# Altium footprint library Footprints.PcbLib: 236 footprints (part 9 of 15)
Each footprint in its own frame and in the unit in brackets; x right, y up, seen from the top. Pads: shape width x height; smd on the part's side, far side on the other; paste and mask are expansions set on the pad; w line width, h text height; cw(c..) or ccw(c..) is an arc to the next point about the centre after c.
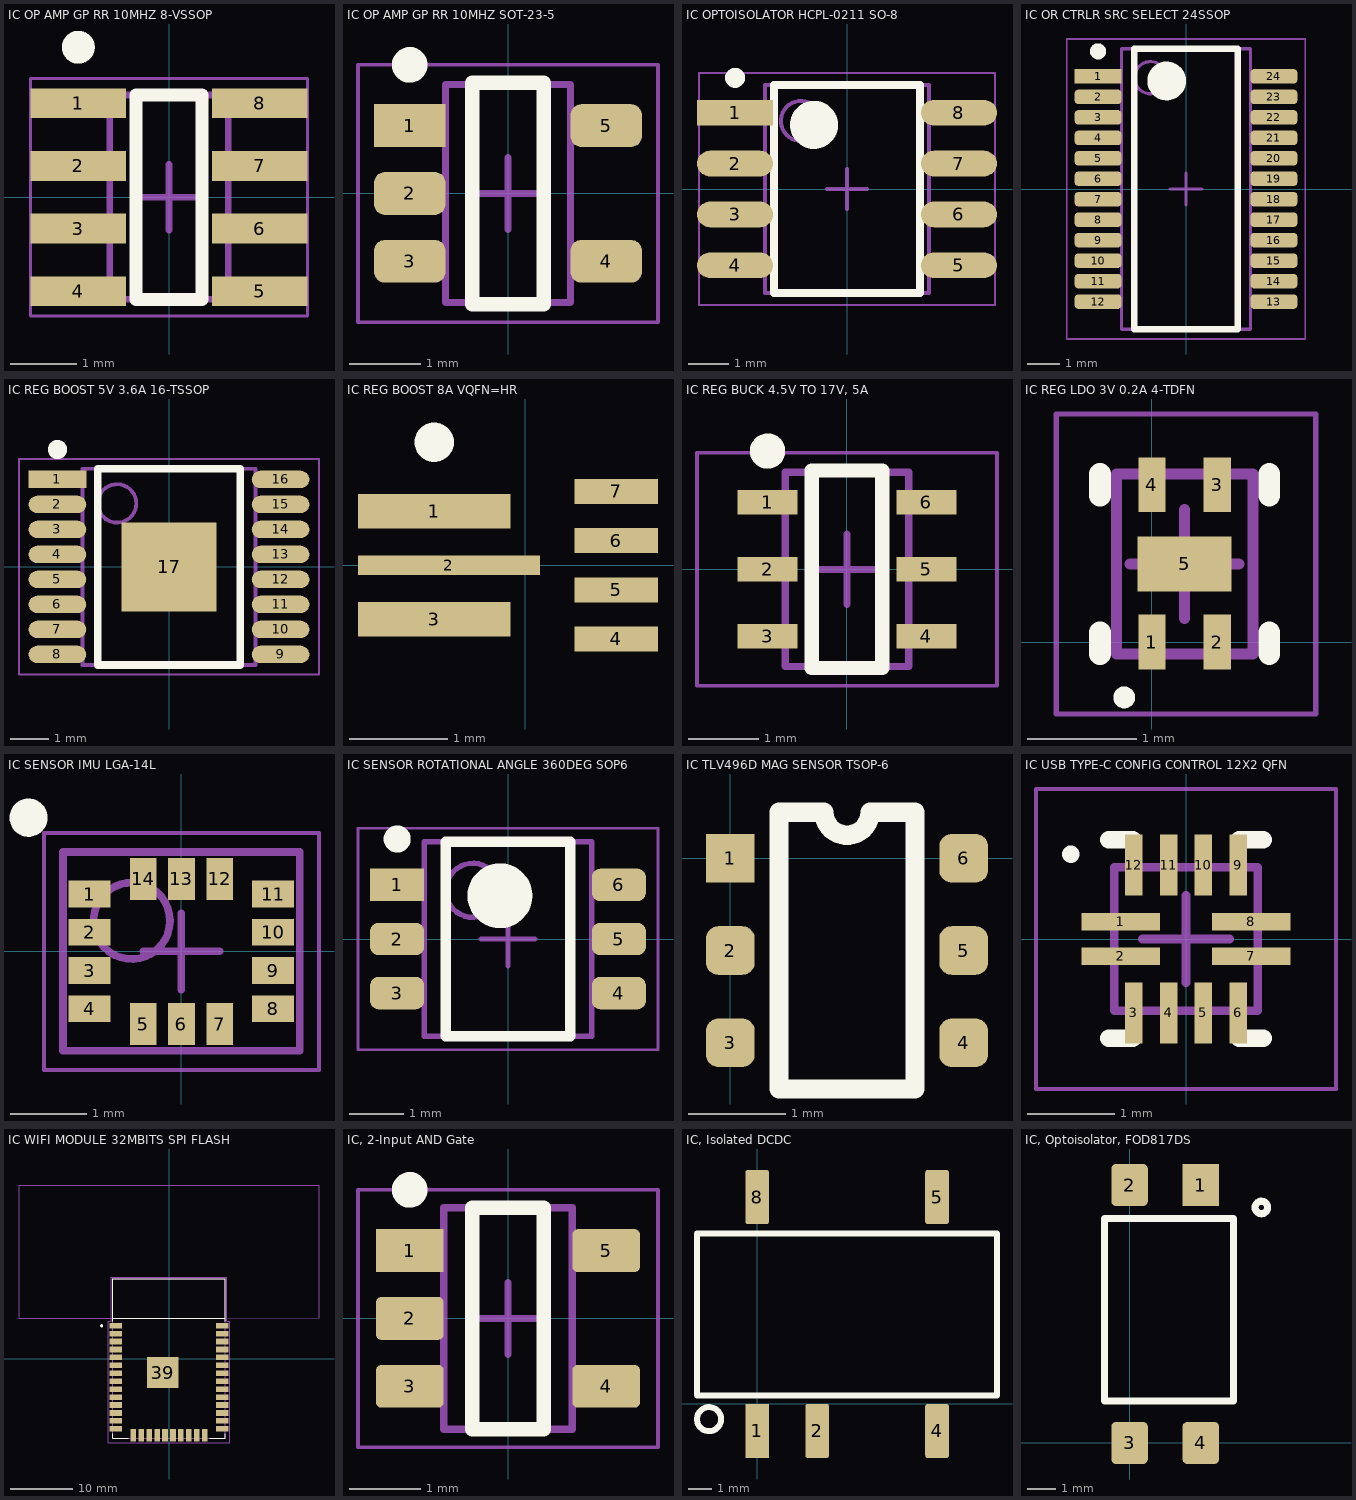
[diagram p8: the footprints below, top view; thin cyan lines are the x and y axes]

## IC OP AMP GP RR 10MHZ 8-VSSOP [mm] "General Purpose Amplifier 2 Circuit Rail-to-Rail 8-VSSOP"
height 1.45
pads (8):
  rect 1.45x0.45 smd: 1(-1.375,1.425) 2(-1.375,0.475) 3(-1.375,-0.475) 4(-1.375,-1.425) 5(1.375,-1.425) 6(1.375,-0.475) 7(1.375,0.475) 8(1.375,1.425)
Top Overlay:
  circle w0.25: c-1.375,2.275 r0.125
  lines w0.2: -0.5,-1.55 0.5,-1.55 0.5,1.55 -0.5,1.55 -0.5,-1.55
Mechanical 13:
  lines w0.1: -0.9,-1.55 0.9,-1.55 0.9,1.55 -0.9,1.55 -0.9,-1.55
Mechanical 15:
  lines w0.05: -2.1,-1.8 2.1,-1.8 2.1,1.8 -2.1,1.8 -2.1,-1.8
  lines w0.1: -0.5,0 0.5,0 ; 0,-0.5 0,0.5
3D body "IC OP AMP GP RR 10MHZ 8-VSSOP  .step": height 1.45, standoff 0.01, extent -1.393,-1.625 1.393,1.625

## IC OP AMP GP RR 10MHZ SOT-23-5 [mm] "SOT23, 5-Leads, Body 2.90x2.80mm, Pitch 0.95mm, IPC Medium Density"
height 1.45
pads (5):
  rect 1x0.6 smd: 1(-1.375,0.95)
  rrect50% 1x0.6 smd: 2(-1.375,0) 3(-1.375,-0.95) 4(1.375,-0.95) 5(1.375,0.95)
Top Overlay:
  circle w0.25: c-1.375,1.8 r0.125
  lines w0.2: -0.5,-1.55 -0.5,1.55 0.5,1.55 0.5,-1.55 -0.5,-1.55
Mechanical 13:
  lines w0.1: -0.875,-1.525 0.875,-1.525 0.875,1.525 -0.875,1.525 -0.875,-1.525
Mechanical 15:
  lines w0.05: -2.1,-1.8 2.1,-1.8 2.1,1.8 -2.1,1.8 -2.1,-1.8
  lines w0.1: -0.5,0 0.5,0 ; 0,-0.5 0,0.5
3D body "IC OP AMP GP RR 10MHZ SOT-23-5.step": height 1.45, standoff 0, extent -1.5,-1.525 1.5,1.525

## IC OPTOISOLATOR HCPL-0211 SO-8 [mm] "SOIC, 8-Leads, Body 5.08x3.94mm, Pitch 1.27mm, IPC Medium Density"
height 3.2
pads (8):
  rect 1.9x0.64 smd: 1(-2.795,1.905)
  oval 1.9x0.64 smd: 2(-2.795,0.635) 3(-2.795,-0.635) 4(-2.795,-1.905) 5(2.795,-1.905) 6(2.795,-0.635) 7(2.795,0.635) 8(2.795,1.905)
Top Overlay:
  circle w0.6: c-0.825,1.6 r0.3
  circle w0.25: c-2.795,2.775 r0.125
  lines w0.2: -1.825,-2.6 1.825,-2.6 1.825,2.6 -1.825,2.6 -1.825,-2.6
Assembly Top:
  circle w0.1: c-1.15,1.7 r0.5
  lines w0.1: -2.05,-2.6 2.05,-2.6 2.05,2.6 -2.05,2.6 -2.05,-2.6
Courtyard Top:
  lines w0.05: -3.7,-2.9 3.7,-2.9 3.7,2.9 -3.7,2.9 -3.7,-2.9
  lines w0.1: -0.5,0 0.5,0 ; 0,-0.5 0,0.5
3D body "IC OPTOISOLATOR HCPL-0211 SO-8.step": height 3.2, standoff 0, extent -2.997,-2.6 2.997,2.6

## IC OR CTRLR SRC SELECT 24SSOP [mm] "LTC4417"
height 1.75
pads (24):
  rect 1.45x0.45 smd: 1(-2.725,3.492)
  rrect50% 1.45x0.45 smd: 2(-2.725,2.857) 3(-2.725,2.222) 4(-2.725,1.587) 5(-2.725,0.953) 6(-2.725,0.318) 7(-2.725,-0.318) 8(-2.725,-0.953) 9(-2.725,-1.587) 10(-2.725,-2.222) 11(-2.725,-2.857) 12(-2.725,-3.492) 13(2.725,-3.492) 14(2.725,-2.857) 15(2.725,-2.222) 16(2.725,-1.587) 17(2.725,-0.953) 18(2.725,-0.318) 19(2.725,0.318) 20(2.725,0.953) 21(2.725,1.587) 22(2.725,2.222) 23(2.725,2.857) 24(2.725,3.492)
Top Overlay:
  circle w0.25: c-2.725,4.267 r0.125
  circle w0.6: c-0.6,3.35 r0.3
  lines w0.2: -1.6,-4.35 -1.6,4.35 1.6,4.35 1.6,-4.35 -1.6,-4.35
Mechanical 13:
  circle w0.1: c-1.1,3.45 r0.5
  lines w0.1: -2,-4.35 -2,4.35 2,4.35 2,-4.35 -2,-4.35
Mechanical 15:
  lines w0.05: -3.7,-4.65 -3.7,4.65 3.7,4.65 3.7,-4.65 -3.7,-4.65
  lines w0.1: -0.5,0 0.5,0 ; 0,-0.5 0,0.5
3D body "IC OR CTRLR SRC SELECT 24SSOP.step": height 1.75, standoff 0, extent -3.004,-4.35 3.004,4.35

## IC REG BOOST 5V 3.6A 16-TSSOP [mm]
height 1.2
pads (17):
  rect 1.5x0.45 smd: 1(-2.9,2.275)
  oval 1.5x0.45 smd: 2(-2.9,1.625) 3(-2.9,0.975) 4(-2.9,0.325) 5(-2.9,-0.325) 6(-2.9,-0.975) 7(-2.9,-1.625) 8(-2.9,-2.275) 9(2.9,-2.275) 10(2.9,-1.625) 11(2.9,-0.975) 12(2.9,-0.325) 13(2.9,0.325) 14(2.9,0.975) 15(2.9,1.625) 16(2.9,2.275)
  rect 2.46x2.31 smd: 17(0,0)
Top Overlay:
  circle w0.25: c-2.9,3.05 r0.125
  lines w0.2: -1.85,-2.55 -1.85,2.55 1.85,2.55 1.85,-2.55 -1.85,-2.55
Assembly Top (Mech9):
  circle w0.1: c-1.35,1.65 r0.5
  lines w0.1: -2.25,-2.55 -2.25,2.55 2.25,2.55 2.25,-2.55 -2.25,-2.55
Courtyard Top (Mech11):
  lines w0.05: -3.9,-2.8 -3.9,2.8 3.9,2.8 3.9,-2.8 -3.9,-2.8
  lines w0.1: -0.5,0 0.5,0 ; 0,-0.5 0,0.5
3D body "IC REG BOOST 5V 3.6A 16-TSSOP.step": height 1.2, standoff 0, extent -3.2,-2.55 3.2,2.55

## IC REG BOOST 8A VQFN=HR [mm]
pads (7):
  rect 1.55x0.35 smd: 1(-0.925,0.55) 3(-0.925,-0.55)
  rect 1.85x0.2 smd: 2(-0.775,0)
  rect 0.85x0.254 smd: 4(0.925,-0.75) 5(0.925,-0.25) 6(0.925,0.25) 7(0.925,0.75)
Top Overlay:
  circle w0.2: c-0.925,1.25 r0.1
3D body "RWU0007A.stp": height 1, standoff 0, extent -1.112,-1 0.888,1

## IC REG BUCK 4.5V TO 17V, 5A [mm] "Buck Switching Regulator IC Positive Adjustable 0.6V 1 Output 5A SOT-23-6 Thin, TSOT-23-6"
height 1.1
pads (6):
  rect 0.85x0.35 smd: 1(-1.125,0.95) 2(-1.125,0) 3(-1.125,-0.95) 4(1.125,-0.95) 5(1.125,0) 6(1.125,0.95)
Top Overlay:
  circle w0.25: c-1.125,1.675 r0.125
  lines w0.2: -0.5,-1.4 -0.5,1.4 0.5,1.4 0.5,-1.4 -0.5,-1.4
Assembly Top:
  lines w0.1: -0.875,-1.375 0.875,-1.375 0.875,1.375 -0.875,1.375 -0.875,-1.375
Courtyard Top:
  lines w0.05: -2.125,-1.65 2.125,-1.65 2.125,1.65 -2.125,1.65 -2.125,-1.65
  lines w0.1: -0.5,0 0.5,0 ; 0,-0.5 0,0.5
3D body "IC REG BUCK 4.5V TO 17V, 5A.step": height 1.1, standoff 0, extent -1.525,-1.375 1.525,1.375

## IC REG LDO 3V 0.2A 4-TDFN [mm] "QFN, 4-Leads, Body 1.20x1.60mm, Pitch 0.50mm/1.40mm, Thermal Pad 0.86x0.50mm, IPC Medium Density"
height 0.6
pads (5):
  rect 0.25x0.5 smd: 1(0,0) 2(0.6,0) 3(0.6,1.44) 4(0,1.44)
  rect 0.86x0.5 smd: 5(0.3,0.715)
Top Overlay:
  circle w0.1: c-0.254,-0.508 r0.05
  lines w0.2: -0.475,-0.11 -0.475,0.09 ; -0.475,1.34 -0.475,1.54 ; 1.075,-0.11 1.075,0.09 ; 1.075,1.34 1.075,1.54
Mechanical 13:
  lines w0.1: -0.325,-0.11 -0.325,1.54 0.925,1.54 0.925,-0.11 -0.325,-0.11
Mechanical 15:
  lines w0.05: -0.875,-0.66 -0.875,2.09 1.5,2.09 1.5,-0.66 -0.875,-0.66
  lines w0.1: -0.2,0.715 0.8,0.715 ; 0.3,0.215 0.3,1.215
3D body "IC REG LDO 3V 0.2A 4-TDFN.step": height 0.6, standoff 0, extent -0.325,-0.111 0.925,1.541

## IC SENSOR IMU LGA-14L [mm] "PQFN, 14-Leads, Body 3.00x2.50mm, Pitch 0.50mm, IPC Medium Density"
height 0.86
pads (14):
  rect 0.55x0.35 smd: 1(-1.2,0.75) 2(-1.2,0.25) 3(-1.2,-0.25) 4(-1.2,-0.75) 8(1.2,-0.75) 9(1.2,-0.25) 10(1.2,0.25) 11(1.2,0.75)
  rect 0.35x0.55 smd: 5(-0.5,-0.95) 6(0,-0.95) 7(0.5,-0.95) 12(0.5,0.95) 13(0,0.95) 14(-0.5,0.95)
Top Overlay:
  circle w0.25: c-2,1.75 r0.125
Mechanical 13:
  circle w0.1: c-0.65,0.4 r0.5
  lines w0.1: -1.55,-1.3 1.55,-1.3 1.55,1.3 -1.55,1.3 -1.55,-1.3
Mechanical 15:
  lines w0.05: -1.8,-1.55 1.8,-1.55 1.8,1.55 -1.8,1.55 -1.8,-1.55
  lines w0.1: -0.5,0 0.5,0 ; 0,-0.5 0,0.5
3D body "IC SENSOR IMU LGA-14L.step": height 0.86, standoff 0, extent -1.55,-1.3 1.55,1.3

## IC SENSOR ROTATIONAL ANGLE 360DEG SOP6 [mm] "TSOP, 6-Leads, Body 3.60x3.00mm, Pitch 1.00mm, IPC Medium Density"
height 1.05
pads (6):
  rect 1x0.6 smd: 1(-2.05,1)
  rrect50% 1x0.6 smd: 2(-2.05,0) 3(-2.05,-1) 4(2.05,-1) 5(2.05,0) 6(2.05,1)
Top Overlay:
  circle w0.25: c-2.05,1.85 r0.125
  circle w0.6: c-0.15,0.8 r0.3
  lines w0.2: -1.15,-1.8 -1.15,1.8 1.15,1.8 1.15,-1.8 -1.15,-1.8
Mechanical 13:
  circle w0.1: c-0.65,0.9 r0.5
  lines w0.1: -1.55,-1.8 -1.55,1.8 1.55,1.8 1.55,-1.8 -1.55,-1.8
Mechanical 15:
  lines w0.05: -2.775,-2.05 -2.775,2.05 2.775,2.05 2.775,-2.05 -2.775,-2.05
  lines w0.1: -0.5,0 0.5,0 ; 0,-0.5 0,0.5
3D body "IC SENSOR ROTATIONAL ANGLE 360DEG SOP6.step": height 1.05, standoff 0, extent -2.1,-1.8 2.1,1.8

## IC TLV496D MAG SENSOR TSOP-6 [mm]
pads (6):
  rect 0.5x0.5 smd: 1(0,0)
  rrect50% 0.5x0.5 smd: 2(0,-0.95) 3(0,-1.9) 4(2.4,-1.9) 5(2.4,-0.95) 6(2.4,0)
Top Overlay:
  lines w0.2: 0.5,-2.375 0.5,0.475 0.962,0.475 ccw(c1.2,0.475) 1.438,0.475 1.9,0.475 1.9,-2.375 0.5,-2.375
3D body "User Library-TSOP-6.step": height 1, standoff 0, extent -0.105,-2.44 2.595,0.56

## IC USB TYPE-C CONFIG CONTROL 12X2 QFN [mm]
height 0.4
pads (12):
  rect 0.9x0.2 smd: 1(-0.75,0.2) 2(-0.75,-0.2) 7(0.75,-0.2) 8(0.75,0.2)
  rect 0.2x0.7 smd: 3(-0.6,-0.85) 4(-0.2,-0.85) 5(0.2,-0.85) 6(0.6,-0.85) 9(0.6,0.85) 10(0.2,0.85) 11(-0.2,0.85) 12(-0.6,0.85)
Top Overlay:
  circle w0.1: c-1.325,0.975 r0.05
  lines w0.2: -0.889,-1.143 -0.614,-1.143 ; -0.889,1.143 -0.614,1.143 ; 0.614,-1.143 0.889,-1.143 ; 0.614,1.143 0.889,1.143
Assembly Top (Mech9):
  lines w0.1: -0.825,-0.825 -0.825,0.825 0.825,0.825 0.825,-0.825 -0.825,-0.825
Courtyard Top (Mech11):
  lines w0.05: -1.725,-1.725 -1.725,1.725 1.725,1.725 1.725,-1.725 -1.725,-1.725
  lines w0.1: -0.5,0 0.5,0 ; 0,-0.5 0,0.5
3D body "IC USB TYPE-C CONFIG CONTROL 12X2 QFN.step": height 0.4, standoff 0, extent -0.875,-0.875 0.875,0.875

## IC WIFI MODULE 32MBITS SPI FLASH [mm]
pads (39):
  rect 2x0.9 smd: 1(-8.5,5.26) 2(-8.5,3.99) 3(-8.5,2.72) 4(-8.5,1.45) 5(-8.5,0.18) 6(-8.5,-1.09) 7(-8.5,-2.36) 8(-8.5,-3.63) 9(-8.5,-4.9) 10(-8.5,-6.17) 11(-8.5,-7.44) 12(-8.5,-8.71) 13(-8.5,-9.98) 14(-8.5,-11.25) 25(8.5,-11.25) 26(8.5,-9.98) 27(8.5,-8.71) 28(8.5,-7.44) 29(8.5,-6.17) 30(8.5,-4.9) 31(8.5,-3.63) 32(8.5,-2.36) 33(8.5,-1.09) 34(8.5,0.18) 35(8.5,1.45) 36(8.5,2.72) 37(8.5,3.99) 38(8.5,5.26)
  rect 0.9x2 smd: 15(-5.715,-12.25) 16(-4.445,-12.25) 17(-3.175,-12.25) 18(-1.905,-12.25) 19(-0.635,-12.25) 20(0.635,-12.25) 21(1.905,-12.25) 22(3.175,-12.25) 23(4.445,-12.25) 24(5.715,-12.25)
  rect 5x5 smd: 39(-1,-2.24)
Top Overlay:
  circle w0.3: c-10.777,5.238 r0.1
  lines w0.127: -9,-12 -9,-12.75 -6.5,-12.75 ; -9,6 -9,12.75 9,12.75 9,6 ; -8.96,6.45 8.96,6.45 ; 6.5,-12.75 9,-12.75 9,-12
Top Paste:
  region: -2.584,-0.659 0.581,-0.659 0.581,-3.825 -2.584,-3.825
Assembly Bottom:
  circle w0.3: c-8.277,5.238 r0.1
  circle w0.3: c-8.277,5.238 r0.1
  lines w0.127: -9,-12.75 9,-12.75 ; -9,-12.75 -9,12.75 ; -9,-12.75 9,-12.75 ; -9,-12.75 -9,12.75 ; -9,12.75 9,12.75 ; -9,12.75 9,12.75 ; 9,-12.75 9,12.75 ; 9,-12.75 9,12.75 ; -8.96,6.45 8.96,6.45 -8.96,6.45
  text "ANTENNA" at -5.725,8.401 h1.88
  text "ANTENNA" at -5.725,8.401 h1.88
Assembly Top (Mech9):
  lines w0.2: -8.96,6.45 -24,6.45 -24,21.75 -24,27.75 24,27.75 24,6.5 8.96,6.45
  text "KEEP OUT / NO COPPER / NO TRACES / NO COMPONENTS" at -6.548,16 h1.1
Mechanical 16:
  lines w0.05: -9.75,-13.5 9.75,-13.5 9.75,6 9.25,6 9.25,13 -9.25,13 -9.25,6 -9.75,6 -9.75,-13.5
3D body "ESP32-WROOM-32D--3DModel-STEP-56544.STEP": height 3.25, standoff 0, extent -9,-12.75 9,12.75

## IC, 2-Input AND Gate [mm] "IC GATE AND 1CH 2-INP 5-SSOP"
height 1.25
pads (5):
  rect 0.95x0.6 smd: 1(-1.375,0.95)
  rrect25% 0.95x0.6 smd: 2(-1.375,0) 3(-1.375,-0.95) 4(1.375,-0.95) 5(1.375,0.95)
Top Overlay:
  circle w0.25: c-1.375,1.8 r0.125
  lines w0.2: -0.5,-1.55 0.5,-1.55 0.5,1.55 -0.5,1.55 -0.5,-1.55
Mechanical 13:
  lines w0.1: -0.9,-1.55 0.9,-1.55 0.9,1.55 -0.9,1.55 -0.9,-1.55
Mechanical 15:
  lines w0.05: -2.1,-1.8 2.1,-1.8 2.1,1.8 -2.1,1.8 -2.1,-1.8
  lines w0.1: -0.5,0 0.5,0 ; 0,-0.5 0,0.5
3D body: height 1.25, standoff 0, extent -0.899,-1.549 0.899,1.549

## IC, Isolated DCDC [mm]
pads (5):
  rect 1x2.29 smd: 1(0,-1.15)
  rrect20% 1x2.29 smd: 2(2.54,-1.15) 4(7.62,-1.15) 5(7.62,8.76) 8(0,8.76)
Top Overlay:
  circle w0.254: c-2.04,-0.65 r0.51
  lines w0.254: -2.54,0.35 -2.54,7.22 10.16,7.22 10.16,0.35 -2.54,0.35
3D body: height 7, standoff 0.25, extent -2.539,0.351 10.159,7.219

## IC, Optoisolator, FOD817DS [mm]
pads (4):
  rect 1.3x1.5 smd: 1(2.54,9.2)
  rrect25% 1.3x1.5 smd: 2(0,9.2) 3(0,0) 4(2.54,0)
Top Overlay:
  circle w0.254: c4.7,8.4 r0.224
  lines w0.254: -0.9,1.5 -0.9,8 3.7,8 3.7,1.5 -0.9,1.5
3D body: height 3.5, standoff 0.85, extent -0.899,1.501 3.699,7.999